# Altium footprint library 1.31-LED发光二极管.PcbLib: 46 footprints (part 1 of 3)
Each footprint in its own frame and in the unit in brackets; x right, y up, seen from the top. Pads: shape width x height; smd on the part's side, far side on the other; paste and mask are expansions set on the pad; w line width, h text height; cw(c..) or ccw(c..) is an arc to the next point about the centre after c.
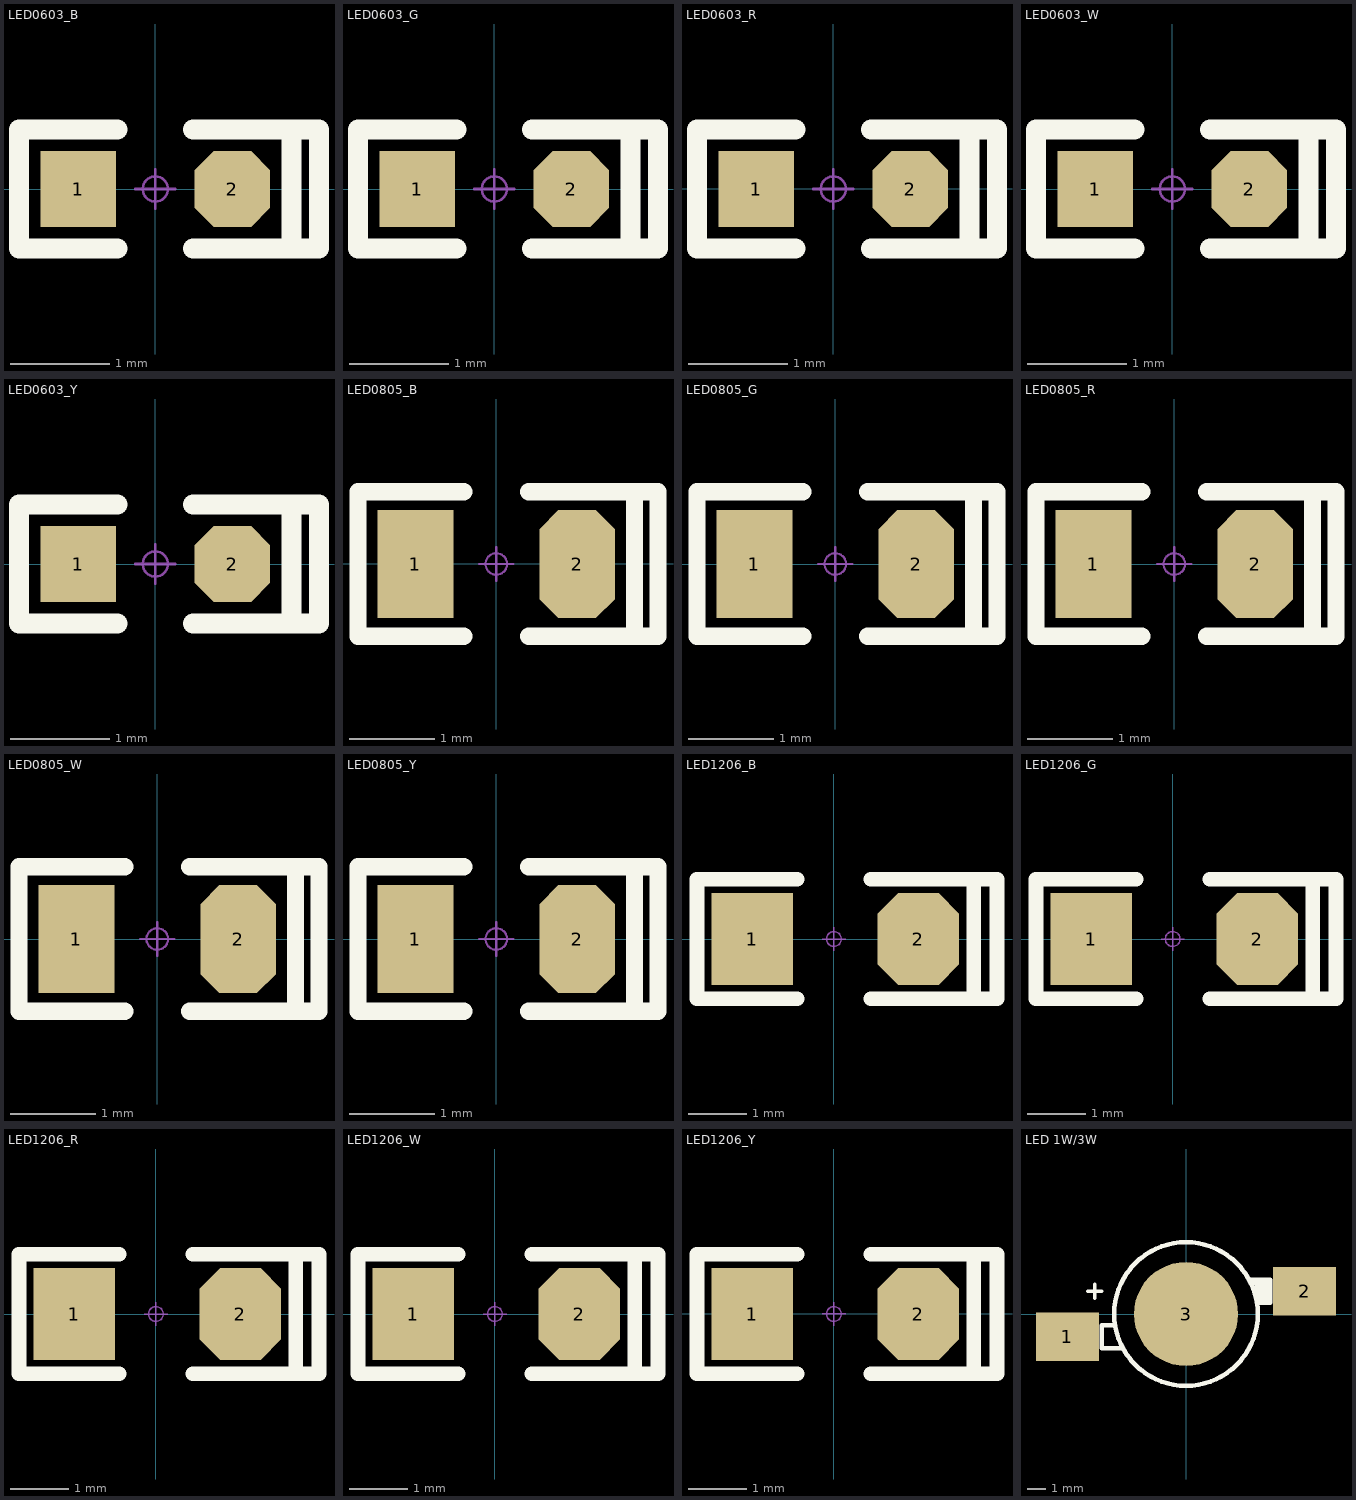
[diagram p0: the footprints below, top view; thin cyan lines are the x and y axes]

## LED0603_B [mil] "蓝色0603LED      [ PCB学习群514746572 ]"
pads (2):
  rect 30x30 smd: 1(-30.59,0)
  oct 30x30 smd: 2(30.59,0)
Top Overlay:
  lines w8: -15,-23.62 -54.13,-23.62 -54.13,23.62 -15,23.62 ; 15,-23.62 65,-23.62 65,23.62 15,23.62 ; 54.13,-23.62 54.13,23.62
Mechanical 15:
  circle w1: c0,0 r5
  lines w1: -7.87,0 7.87,0 ; 0,-7.87 0,7.88
3D body "LED 0603玻璃罩.STEP": height 23.82, standoff 8.07, extent -23.62,-15.74 23.63,15.75
3D body "LED_0603-B.STEP": height 18.33, standoff -0.04, extent -31.5,-15.79 31.49,15.79

## LED0603_G [mil] "绿色0603LED      [ PCB学习群514746572 ]"
pads (2):
  rect 30x30 smd: 1(-30.59,0)
  oct 30x30 smd: 2(30.59,0)
Top Overlay:
  lines w8: -15,-23.62 -54.13,-23.62 -54.13,23.63 -15,23.63 ; 15,-23.62 65,-23.62 65,23.63 15,23.63 ; 54.14,-23.62 54.14,23.63
Mechanical 15:
  circle w1: c0,0 r5
  lines w1: -7.87,0 7.88,0 ; 0,-7.87 0,7.88
3D body "LED_0603-G(1).STEP": height 18.33, standoff -0.04, extent -31.5,-15.79 31.49,15.79
3D body "LED 0603玻璃罩.STEP": height 23.82, standoff 8.07, extent -23.62,-15.75 23.62,15.74

## LED0603_R [mil] "红色0603LED      [ PCB学习群514746572 ]"
pads (2):
  rect 30x30 smd: 1(-30.59,0)
  oct 30x30 smd: 2(30.59,0)
Top Overlay:
  lines w8: -15.01,-23.63 -54.14,-23.63 -54.14,23.62 -15.01,23.62 ; 14.99,-23.63 65,-23.63 65,23.62 14.99,23.62 ; 54.13,-23.63 54.13,23.62
Mechanical 15:
  circle w1: c0,0 r5
  lines w1: -7.88,0 7.87,0 ; 0,-7.88 0,7.87
3D body "LED_0603-R.STEP": height 18.33, standoff -0.04, extent -31.5,-15.79 31.49,15.79
3D body "LED 0603玻璃罩.STEP": height 23.82, standoff 8.07, extent -23.63,-15.75 23.62,15.74

## LED0603_W [mil] "白色0603LED      [ PCB学习群514746572 ]"
pads (2):
  rect 30x30 smd: 1(-30.59,0)
  oct 30x30 smd: 2(30.59,0)
Top Overlay:
  lines w8: -15,-23.62 -54.13,-23.62 -54.13,23.62 -15,23.62 ; 15,-23.62 65,-23.62 65,23.62 15,23.62 ; 54.13,-23.62 54.13,23.62
Mechanical 15:
  circle w1: c0,0 r5
  lines w1: -7.87,0 7.87,0 ; 0,-7.87 0,7.87
3D body "LED_0603-W.STEP": height 18.33, standoff -0.04, extent -31.5,-15.79 31.49,15.79
3D body "LED 0603玻璃罩.STEP": height 23.82, standoff 8.07, extent -23.62,-15.75 23.62,15.75

## LED0603_Y [mil] "黄色0603LED      [ PCB学习群514746572 ]"
pads (2):
  rect 30x30 smd: 1(-30.59,0)
  oct 30x30 smd: 2(30.59,0)
Top Overlay:
  lines w8: -15,-23.62 -54.13,-23.62 -54.13,23.62 -15,23.62 ; 15,-23.62 65,-23.62 65,23.62 15,23.62 ; 54.13,-23.62 54.13,23.62
Mechanical 15:
  circle w1: c0,0 r5
  lines w1: -7.87,0 7.87,0 ; 0,-7.87 0,7.87
3D body "LED_0603-Y.STEP": height 18.33, standoff -0.04, extent -31.5,-15.79 31.49,15.79
3D body "LED 0603玻璃罩.STEP": height 23.82, standoff 8.07, extent -23.63,-15.75 23.62,15.74

## LED0805_B [mil] "蓝色0805LED      [ PCB学习群514746572 ]"
pads (2):
  rect 35x50 smd: 1(-37.4,-0.01)
  oct 35x50 smd: 2(37.4,-0.01)
Top Overlay:
  lines w8: -15,-33.47 -63.98,-33.47 -63.98,33.46 -15,33.46 ; 15,-33.47 74.8,-33.47 74.8,33.46 15,33.46 ; 63.98,-33.47 63.98,32.48
Mechanical 15:
  circle w1: c0,0 r5
  lines w1: -7.87,0 7.87,0 ; 0,-7.87 0,7.87
3D body "LED_0805-B.STEP": height 26.34, standoff -0.04, extent -39.37,-24.65 39.37,24.64
3D body "LED 0805玻璃罩.STEP": height 31.69, standoff 12.01, extent -29.53,-24.61 29.53,24.6

## LED0805_G [mil] "绿色0805LED      [ PCB学习群514746572 ]"
pads (2):
  rect 35x50 smd: 1(-37.4,0)
  oct 35x50 smd: 2(37.4,0)
Top Overlay:
  lines w8: -15,-33.46 -63.98,-33.46 -63.98,33.46 -15,33.46 ; 15,-33.46 74.8,-33.46 74.8,33.46 15,33.46 ; 63.98,-33.46 63.98,32.48
Mechanical 15:
  circle w1: c0,0 r5
  lines w1: -7.87,0 7.87,0 ; 0,-7.87 0,7.87
3D body "LED_0805-G.STEP": height 26.34, standoff -0.04, extent -39.37,-24.65 39.37,24.64
3D body "LED 0805玻璃罩.STEP": height 31.69, standoff 12.01, extent -29.53,-24.6 29.53,24.6

## LED0805_R [mil] "红色0805LED      [ PCB学习群514746572 ]"
pads (2):
  rect 35x50 smd: 1(-37.41,0)
  oct 35x50 smd: 2(37.4,0)
Top Overlay:
  lines w8: -15,-33.46 -63.98,-33.46 -63.98,33.47 -15,33.47 ; 15,-33.46 74.8,-33.46 74.8,33.47 15,33.47 ; 63.98,-33.46 63.98,32.48
Mechanical 15:
  circle w1: c0,0 r5
  lines w1: -7.87,0 7.87,0 ; 0,-7.87 0,7.87
3D body "LED 0805玻璃罩.STEP": height 31.69, standoff 12.01, extent -29.53,-24.6 29.53,24.61
3D body "LED_0805-R.STEP": height 26.34, standoff -0.04, extent -39.37,-24.65 39.37,24.64

## LED0805_W [mm] "白色0805LED      [ PCB学习群514746572 ]"
pads (2):
  rect 0.889x1.27 smd: 1(-0.95,0)
  oct 0.889x1.27 smd: 2(0.95,0)
Top Overlay:
  lines w0.203: -0.381,-0.85 -1.625,-0.85 -1.625,0.85 -0.381,0.85 ; 0.381,-0.85 1.9,-0.85 1.9,0.85 0.381,0.85 ; 1.625,-0.85 1.625,0.825
Mechanical 15:
  circle w0.025: c0,0 r0.127
  lines w0.025: -0.2,0 0.2,0 ; 0,-0.2 0,0.2
3D body "LED 0805玻璃罩.STEP": height 0.8, standoff 0.31, extent -0.75,-0.625 0.75,0.625
3D body "LED_0805-W.STEP": height 0.67, standoff 0, extent -1,-0.626 1,0.626

## LED0805_Y [mm] "黄色0805LED      [ PCB学习群514746572 ]"
pads (2):
  rect 0.889x1.27 smd: 1(-0.95,0)
  oct 0.889x1.27 smd: 2(0.95,0)
Top Overlay:
  lines w0.203: -0.381,-0.85 -1.625,-0.85 -1.625,0.85 -0.381,0.85 ; 0.381,-0.85 1.9,-0.85 1.9,0.85 0.381,0.85 ; 1.625,-0.85 1.625,0.825
Mechanical 15:
  circle w0.025: c0,0 r0.127
  lines w0.025: -0.2,0 0.2,0 ; 0,-0.2 0,0.2
3D body "LED 0805玻璃罩.STEP": height 0.8, standoff 0.31, extent -0.75,-0.625 0.75,0.625
3D body "LED_0805-Y.STEP": height 0.67, standoff 0, extent -1,-0.626 1,0.626

## LED1206_B [mil] "蓝色1206LED      [ PCB学习群514746572 ]"
pads (2):
  rect 55x62 smd: 1(-55.12,0)
  oct 55x62 smd: 2(57.09,0)
Top Overlay:
  lines w10: -25,-40.35 -92.52,-40.35 -92.52,40.36 -25,40.36 ; 25,-40.35 110.24,-40.35 110.24,40.36 25,40.36 ; 94.49,-37.4 94.49,40.36
Mechanical 15:
  circle w1: c0,0 r5
  lines w1: -7.87,0 7.87,0 ; 0,-7.87 0,7.87
3D body "LED_1206-B.STEP": height 35.56, standoff -0.04, extent -63.03,-31.54 63.03,31.53
3D body "LED 1206玻璃罩.STEP": height 39.57, standoff 19.88, extent -44.33,-31.54 44.33,31.54

## LED1206_G [mil] "绿色1206LED      [ PCB学习群514746572 ]"
pads (2):
  rect 55x62 smd: 1(-54.96,0)
  oct 55x62 smd: 2(57.24,0)
Top Overlay:
  lines w10: -24.84,-40.35 -92.36,-40.35 -92.36,40.35 -24.84,40.35 ; 25.16,-40.35 110.39,-40.35 110.39,40.35 25.16,40.35 ; 94.65,-37.4 94.65,40.35
Mechanical 15:
  circle w1: c0,0 r5
  lines w1: -7.87,0 7.87,0 ; 0,-7.87 0,7.87
3D body "LED_1206-G.STEP": height 35.56, standoff -0.04, extent -63.03,-31.54 63.03,31.53
3D body "LED 1206玻璃罩.STEP": height 39.57, standoff 19.88, extent -44.17,-31.54 44.48,31.53

## LED1206_R [mil] "红色1206LED      [ PCB学习群514746572 ]"
pads (2):
  rect 55x62 smd: 1(-55.12,0)
  oct 55x62 smd: 2(57.09,0)
Top Overlay:
  lines w10: -25,-40.35 -92.52,-40.35 -92.52,40.35 -25,40.35 ; 25,-40.35 110.24,-40.35 110.24,40.35 25,40.35 ; 94.49,-37.4 94.49,40.35
Mechanical 15:
  circle w1: c0,0 r5
  lines w1: -7.87,0 7.87,0 ; 0,-7.87 0,7.87
3D body "LED 1206玻璃罩.STEP": height 39.57, standoff 19.88, extent -44.33,-31.54 44.32,31.53
3D body "LED_1206-R.STEP": height 35.56, standoff -0.04, extent -63.03,-31.54 63.03,31.53

## LED1206_W [mil] "白色1206LED      [ PCB学习群514746572 ]"
pads (2):
  rect 55x62 smd: 1(-55.12,0)
  oct 55x62 smd: 2(57.09,0)
Top Overlay:
  lines w10: -25,-40.35 -92.52,-40.35 -92.52,40.35 -25,40.35 ; 25,-40.35 110.24,-40.35 110.24,40.35 25,40.35 ; 94.49,-37.4 94.49,40.35
Mechanical 15:
  circle w1: c0,0 r5
  lines w1: -7.87,0 7.87,0 ; 0,-7.87 0,7.87
3D body "LED 1206玻璃罩.STEP": height 39.57, standoff 19.88, extent -44.33,-31.54 44.32,31.53
3D body "LED_1206-W.STEP": height 35.56, standoff -0.04, extent -63.03,-31.54 63.03,31.53

## LED1206_Y [mil] "黄色1206LED      [ PCB学习群514746572 ]"
pads (2):
  rect 55x62 smd: 1(-55.12,0)
  oct 55x62 smd: 2(57.09,0)
Top Overlay:
  lines w10: -25,-40.36 -92.52,-40.36 -92.52,40.35 -25,40.35 ; 25,-40.36 110.24,-40.36 110.24,40.35 25,40.35 ; 94.49,-37.4 94.49,40.35
Mechanical 15:
  circle w1: c0,0 r5
  lines w1: -7.87,0 7.87,0 ; 0,-7.87 0,7.87
3D body "LED_1206-Y.STEP": height 35.56, standoff -0.04, extent -63.03,-31.54 63.03,31.53
3D body "LED 1206玻璃罩.STEP": height 39.57, standoff 19.88, extent -44.33,-31.54 44.33,31.53

## LED 1W/3W [mm] "大功率LED      [ PCB学习群514746572 ]"
pads (3):
  rect 3.5x2.7 smd: 1(-6.604,-1.27) 2(6.604,1.27)
  round 5.8 smd: 3(0,0)
Top Overlay:
  circle w0.254: c0,0 r4
  lines w0.203: -5.461,1.27 -4.699,1.27 ; -5.08,0.889 -5.08,1.651
  lines w0.254: -4.064,-0.635 -4.699,-0.635 -4.699,-1.905 -3.556,-1.905 ; 3.937,1.524 ccw(c3.556,1.524) 3.556,1.905 4.699,1.905 4.699,0.635 4.064,0.635 cw(c4.064,0.762) 3.937,0.762 3.937,1.905 ; 4.191,0.635 4.191,1.905 ; 4.445,0.635 4.445,1.905
Mechanical 15:
  circle w0.05: c0,0 r0.35
  lines w0.05: -0.5,0 0.5,0 ; 0,-0.5 0,0.5
3D body "LED 1W 基体.STEP": height 3.65, standoff 0.05, extent -7.2,-4 7.2,4